# Altium footprint library UD2 CPLD.PcbLib: 43 footprints (part 2 of 3)
Each footprint in its own frame and in the unit in brackets; x right, y up, seen from the top. Pads: shape width x height; smd on the part's side, far side on the other; paste and mask are expansions set on the pad; w line width, h text height; cw(c..) or ccw(c..) is an arc to the next point about the centre after c.
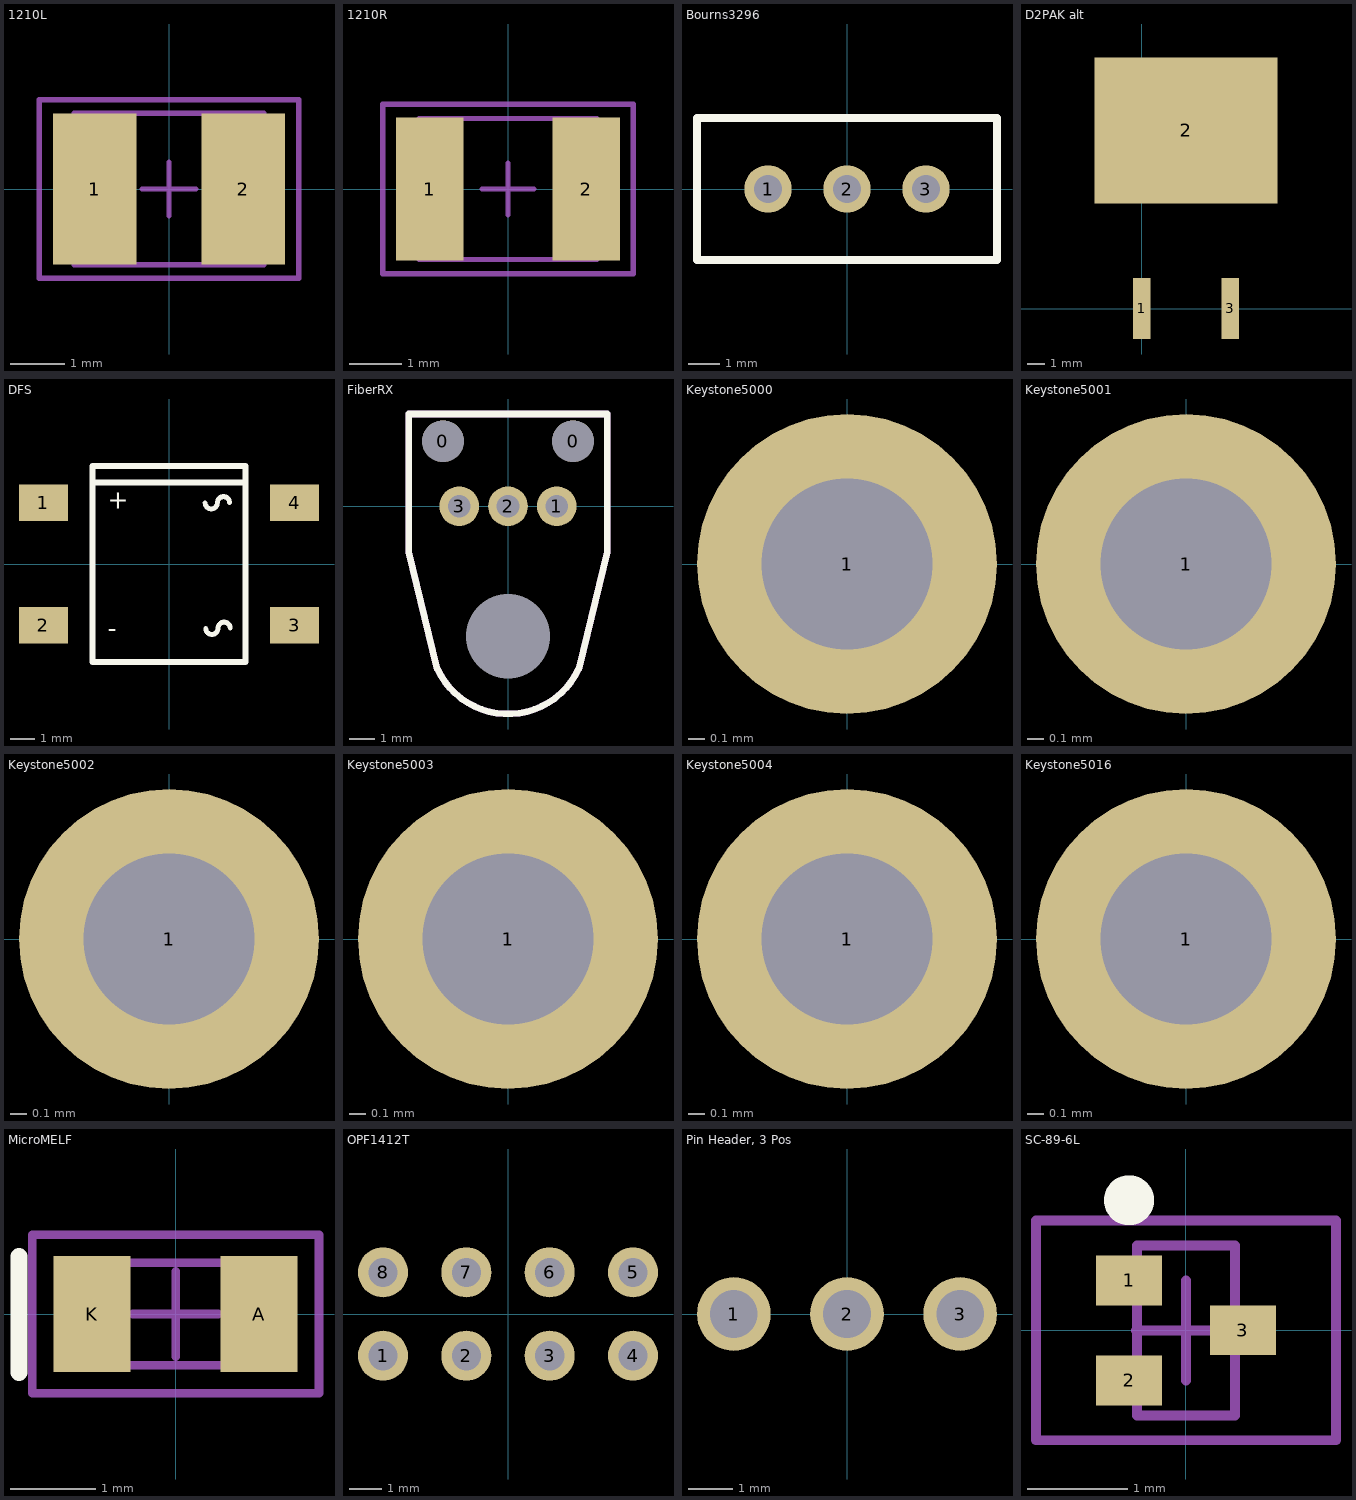
[diagram p1: the footprints below, top view; thin cyan lines are the x and y axes]

## 1210L [mm]
pads (2):
  rect 1.55x2.8 smd: 1(-1.375,0) 2(1.375,0)
Mechanical 13:
  lines w0.1: -1.75,-1.4 1.75,-1.4 1.75,1.4 -1.75,1.4 -1.75,-1.4
Mechanical 15:
  lines w0.1: -0.5,0 0.5,0 ; 0,-0.5 0,0.5 ; -2.4,-1.65 2.4,-1.65 2.4,1.65 -2.4,1.65 -2.4,-1.65
3D body: height 2.5, standoff 0, extent -1.6,-1.25 1.6,1.25

## 1210R [mm]
pads (2):
  rect 1.3x2.75 smd: 1(-1.5,0) 2(1.5,0)
Mechanical 13:
  lines w0.1: -1.7,-1.35 -1.7,1.35 1.7,1.35 1.7,-1.35 -1.7,-1.35
Mechanical 15:
  lines w0.1: -0.5,0 0.5,0 ; 0,-0.5 0,0.5 ; -2.4,-1.625 -2.4,1.625 2.4,1.625 2.4,-1.625 -2.4,-1.625
3D body: height 0.6, standoff 0, extent -1.6,-1.25 1.6,1.25

## Bourns3296 [mil]
pads (3):
  round 60 hole 35: 1(-100,0) 2(0,0) 3(100,0)
Top Overlay:
  lines w10: -190,-90 -190,90 190,90 190,-90 -190,-90
3D body: height 454.72, standoff -300, extent -187.6,-95.08 187.6,95.08

## D2PAK alt [mm]
pads (3):
  rect 1.016x3.504 smd: 1(-0.013,0.012) 3(5.067,0.012)
  rect 10.5x8.38 smd: 2(2.527,10.225)
3D body: height 4.78, standoff -0.02, extent -2.473,-1.485 7.527,14.185

## DFS [mil]
pads (4):
  rect 80x60 smd: 1(-205,100) 2(-205,-100) 3(205,-100) 4(205,100)
Top Overlay:
  lines w8: 59,100 ccw(c69,100) 79,100 cw(c89,100) 99,100 ; 60,-105 ccw(c70,-105) 80,-105 cw(c90,-105) 100,-105
  lines w10: -125,133 125,133 ; -125,-160 125,-160 125,160 -125,160 -125,-160
  text "+" at -100,90 h30
  text "-" at -100,-120 h30
3D body: height 139.76, standoff -0.62, extent -202.76,-167.52 202.76,167.52

## FiberRX [mm]
pads (6):
  round 1.63 hole 1.63 unplated: 0(-2.54,2.54) 0(2.54,2.54)
  round 0 hole 3.3 unplated: 0(0,-5.08)
  round 1.55 hole 0.889: 1(1.905,0) 2(0,0) 3(-1.905,0)
Top Overlay:
  lines w0.254: -2.78,-6.313 -3.875,-1.8 -3.875,3.6 3.875,3.6 3.875,-1.8 2.78,-6.313 ; -2.755,-6.365 ccw(c0,-5.08) 2.755,-6.365
Mechanical 13:
  lines w0.254: -2.78,-6.313 -3.875,-1.8 -3.875,3.6 3.875,3.6 3.875,-1.8 2.78,-6.313 ; -2.755,-6.365 ccw(c0,-5.08) 2.755,-6.365
3D body: height 8.95, standoff -11.8, extent -4.318,-8.27 4.318,19.446

## Keystone5000 [mil] "Keystone 5000 Red Testpoint"
pads (1):
  round 70 hole 40: 1(0,0)
3D body: height 179.92, standoff -120.08, extent -50,-50 50,50

## Keystone5001 [mil] "Keystone 5001 Black Testpoint"
pads (1):
  round 70 hole 40: 1(0,0)
3D body: height 179.92, standoff -120.08, extent -50,-50 50,50

## Keystone5002 [mil] "Keystone 5002 White Testpoint"
pads (1):
  round 70 hole 40: 1(0,0)
3D body: height 179.92, standoff -120.08, extent -50,-50 50,50

## Keystone5003 [mil] "Keystone 5003 Orange Testpoint"
pads (1):
  round 70 hole 40: 1(0,0)
3D body: height 179.92, standoff -120.08, extent -50,-50 50,50

## Keystone5004 [mil] "Keystone 5004 Yellow Testpoint"
pads (1):
  round 70 hole 40: 1(0,0)
3D body: height 179.92, standoff -120.08, extent -50,-50 50,50

## Keystone5016 [mil] "Keystone 5016 Green Testpoint"
pads (1):
  round 70 hole 40: 1(0,0)
3D body: height 179.92, standoff -120.08, extent -50,-50 50,50

## MicroMELF [mm]
pads (2):
  rect 0.9x1.35 smd: A(0.975,0) K(-0.975,0)
Top Overlay:
  lines w0.2: -1.83,-0.68 -1.83,0.67
Mechanical 13:
  rectangle: -1,-0.6 -0.731,0.6
  lines w0.1: -1,-0.6 1,-0.6 1,0.6 -1,0.6 -1,-0.6
Mechanical 15:
  lines w0.1: -0.5,0 0.5,0 ; 0,-0.5 0,0.5 ; -1.675,-0.925 1.675,-0.925 1.675,0.925 -1.675,0.925 -1.675,-0.925
3D body: height 1.13, standoff -0.01, extent -0.965,-0.572 0.965,0.572

## OPF1412T [mil]
pads (8):
  round 60 hole 35: 1(-150,-50) 2(-50,-50) 3(50,-50) 4(150,-50) 5(150,50) 6(50,50) 7(-50,50) 8(-150,50)
3D body: height 401.57, standoff -141.73, extent -249.92,-200 249.92,870.87

## Pin Header, 3 Pos [mil]
pads (3):
  round 65 hole 42: 1(-100,0) 2(0,0) 3(100,0)
3D body: height 335.04, standoff -144.88, extent -150,-57.48 150,57.48

## SC-89-6L [mm]
pads (3):
  rect 0.66x0.5 smd: 1(-0.57,0.5) 2(-0.57,-0.5) 3(0.57,0)
Top Overlay:
  circle w0.25: c-0.57,1.3 r0.125
Mechanical 13:
  lines w0.1: -0.5,0 0.5,0 ; 0,-0.5 0,0.5 ; -1.5,-1.1 -1.5,1.1 1.5,1.1 1.5,-1.1 -1.5,-1.1 ; -0.49,-0.85 -0.49,0.85 0.49,0.85 0.49,-0.85 -0.49,-0.85
3D body: height 0.78, standoff 0.04, extent -0.49,-0.85 0.49,0.85